# Altium footprint library pcb_Active.PcbLib: 86 footprints (part 1 of 6)
Each footprint in its own frame and in the unit in brackets; x right, y up, seen from the top. Pads: shape width x height; smd on the part's side, far side on the other; paste and mask are expansions set on the pad; w line width, h text height; cw(c..) or ccw(c..) is an arc to the next point about the centre after c.
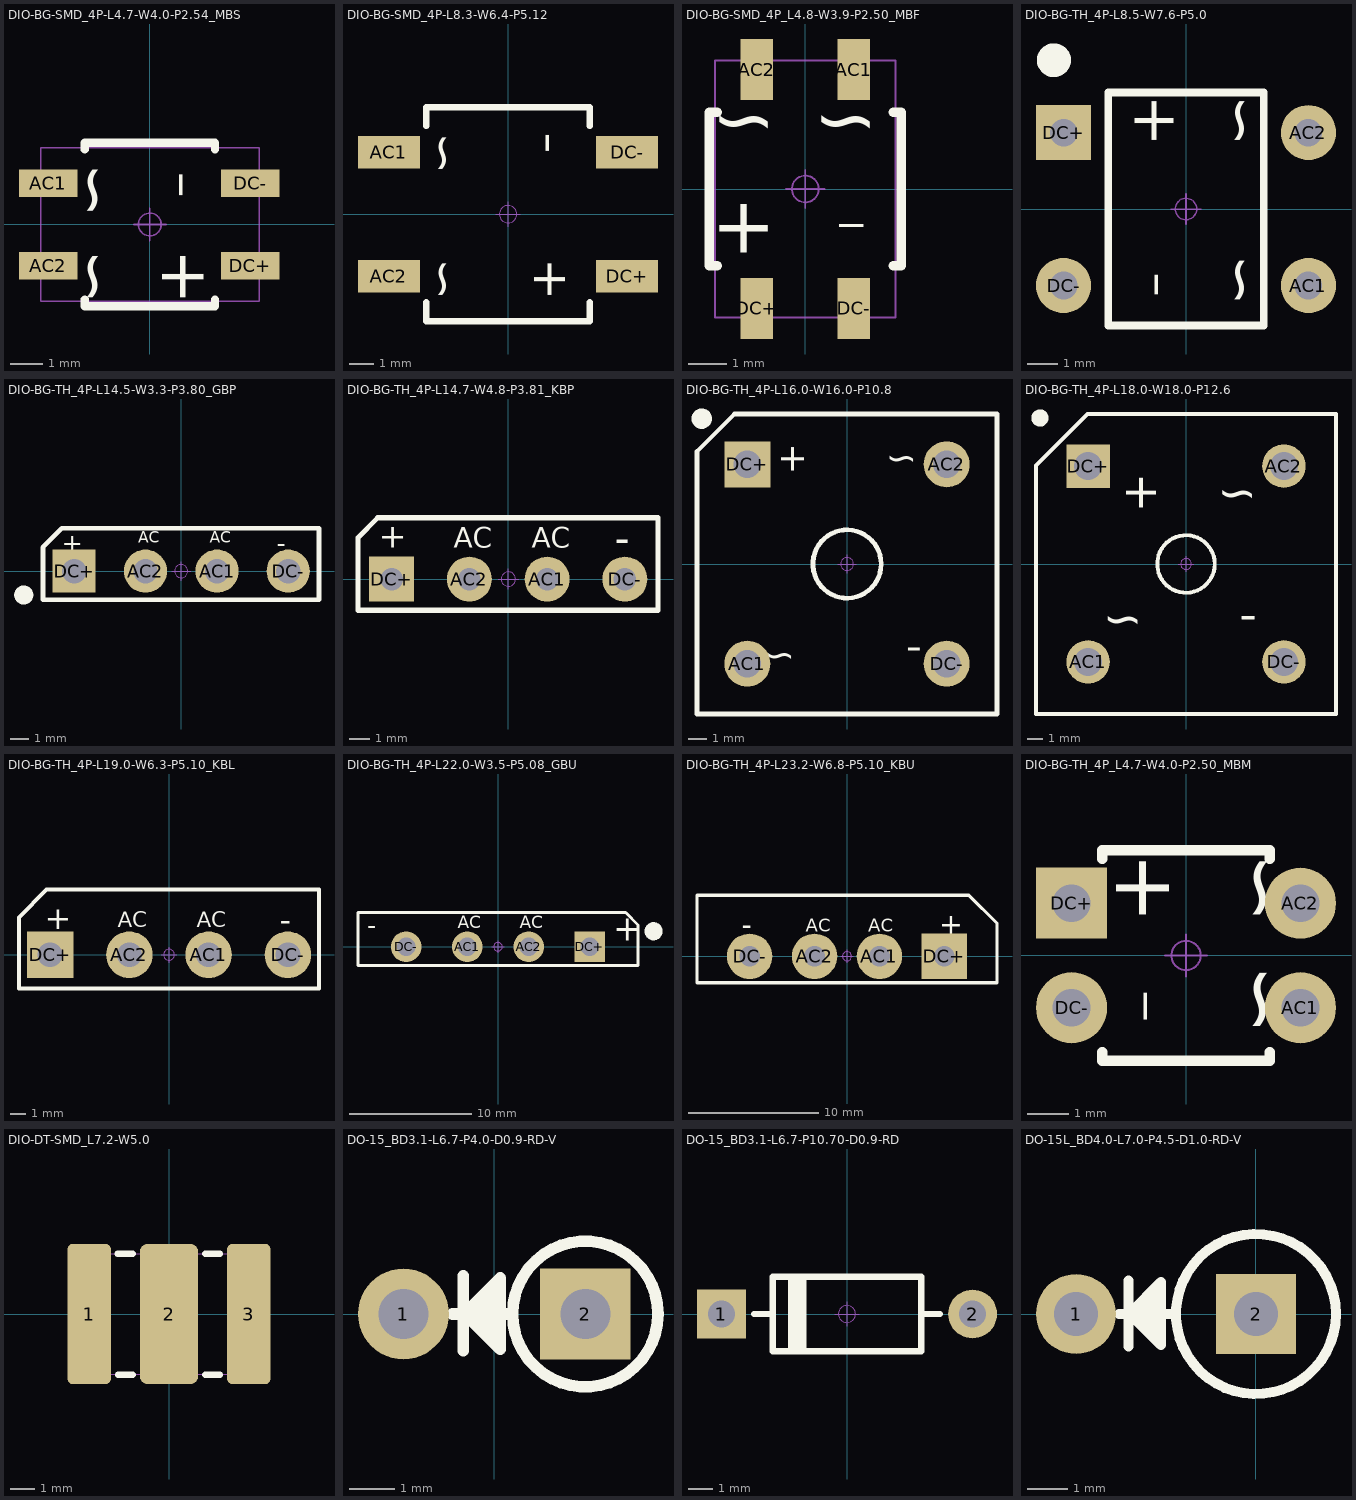
[diagram p0: the footprints below, top view; thin cyan lines are the x and y axes]

## DIO-BG-SMD_4P-L4.7-W4.0-P2.54_MBS [mm] "4.1*6.8*2.5mm(长宽高)"
height 12.3
pads (4):
  rect 1.8x0.85 smd: AC1(-3.127,1.27) AC2(-3.127,-1.27) DC+(3.096,-1.27) DC-(3.096,1.27)
Top Overlay:
  lines w0.254: -2.007,-2.311 -2.007,-2.515 2.007,-2.515 2.007,-2.311 ; -2.007,2.311 -2.007,2.515 2.007,2.515 2.007,2.311
  text "+" at 2.159,-0.762 h2.54
  text "-" at 2.159,1.651 h3.05
  text "~" at -0.635,-0.762 h2.54
  text "~" at -0.635,1.905 h2.54
Mechanical 13:
  lines w0.05: -3.363,-2.363 3.363,-2.363 3.363,2.362 -3.363,2.362 -3.363,-2.363
Mechanical 15:
  circle w0.05: c0,0 r0.35
  lines w0.05: -0.5,0 0.5,0 ; 0,-0.5 0,0.5
Mechanical 16:
  text ".Designator" at 0,0 h1
3D body "MBS.STEP": height 2.6, standoff -0.03, extent -3.4,-2.4 3.4,2.4

## DIO-BG-SMD_4P-L8.3-W6.4-P5.12 [mm] "8.5*10.1*3mm(长宽高)"
height 12.3
pads (4):
  rect 2.5x1.3 smd: AC1(-4.8,2.5) AC2(-4.8,-2.5) DC+(4.8,-2.5) DC-(4.8,2.5)
Top Overlay:
  lines w0.254: -3.302,-3.556 -3.302,-4.318 3.302,-4.318 3.302,-3.556 ; -3.302,3.556 -3.302,4.318 3.302,4.318 3.302,3.556
  text "+" at 2.794,-1.778 h2.54
  text "-" at 2.794,3.302 h3.05
  text "~" at -1.524,-1.778 h2.54
  text "~" at -1.524,3.302 h2.54
Mechanical 15:
  circle w0.05: c0,0 r0.35
  lines w0.05: -0.5,0 0.5,0 ; 0,-0.5 0,0.5
Mechanical 16:
  text ".Designator" at 0,0 h1
3D body "DBS.STEP": height 3.1, standoff -0.03, extent -5.05,-4.25 5.05,4.25

## DIO-BG-SMD_4P_L4.8-W3.9-P2.50_MBF [mm] "4.7*7*1.5mm(长宽高)"
height 12.3
pads (4):
  rect 0.85x1.6 smd: AC1(1.27,3.127) AC2(-1.27,3.127) DC+(-1.27,-3.127) DC-(1.27,-3.127)
Top Overlay:
  lines w0.254: -2.311,-2.007 -2.515,-2.007 -2.515,2.007 -2.311,2.007 ; 2.311,-2.007 2.515,-2.007 2.515,2.007 2.311,2.007
  text "~" at 1.905,0.635 h2.54
  text "~" at -0.762,0.635 h2.54
  text "-" at 1.651,-2.159 h3.05
  text "+" at -0.762,-2.159 h2.54
Mechanical 13:
  lines w0.05: -2.363,-3.363 2.362,-3.363 2.362,3.363 -2.363,3.363 -2.363,-3.363
Mechanical 15:
  circle w0.05: c0,0 r0.35
  lines w0.05: -0.5,0 0.5,0 ; 0,-0.5 0,0.5
Mechanical 16:
  text ".Designator" at 0,0 h1
3D body "MBF.STEP": height 1.6, standoff -0.03, extent -2.35,-3.5 2.35,3.5

## DIO-BG-TH_4P-L8.5-W7.6-P5.0 [mm] "8.5*7.6*3mm(长宽高)"
pads (4):
  round 1.8 hole 0.9: AC1(4.004,-2.5) AC2(4.004,2.5) DC-(-4.004,-2.5)
  rect 1.8x1.8 hole 0.9: DC+(-4.004,2.5)
Top Overlay:
  circle w0.6: c-4.318,4.866 r0.254
  lines w0.254: -2.54,-3.81 2.54,-3.81 2.54,3.81 -2.54,3.81 -2.54,-3.81
  text "~" at 0.635,-3.175 h2.54
  text "~" at 0.635,2.032 h2.54
  text "-" at -2.159,-2.921 h3.05
  text "+" at -2.159,2.032 h2.54
Mechanical 15:
  circle w0.05: c0,0 r0.35
  lines w0.05: -0.5,0 0.5,0 ; 0,-0.5 0,0.5
Mechanical 16:
  text ".Designator" at 0,0 h1
3D body "DB.STEP": height 3.2, standoff -3.01, extent -4.436,-4.25 4.436,4.25

## DIO-BG-TH_4P-L14.5-W3.3-P3.80_GBP [mm] "14.2*2.9*10.5mm(长宽高)"
pads (4):
  round 2.3 hole 1.3: AC1(1.91,0) AC2(-1.9,0) DC-(5.7,0)
  rect 2.3x2.3 hole 1.3: DC+(-5.7,0)
Top Overlay:
  circle w0.508: c-8.382,-1.27 r0.254
  lines w0.254: -7.36,-1.524 7.34,-1.524 7.34,2.286 -6.35,2.286 -7.36,1.276 -7.36,-1.524
  text "AC" at -2.286,1.524 h0.6
  text "-" at 5.08,1.016 h1
  text "+" at -6.35,1.016 h1
  text "AC" at 1.524,1.524 h0.6
Mechanical 15:
  circle w0.05: c0,0 r0.35
  lines w0.05: -0.5,0 0.5,0 ; 0,-0.5 0,0.5
Mechanical 16:
  text ".Designator" at 0,0 h1
3D body "GBP.STEP": height 12.8, standoff -3.6, extent -7.1,-1 7.1,1.9

## DIO-BG-TH_4P-L14.7-W4.8-P3.81_KBP [mm] "14.7*4.8*12.2mm(长宽高)"
pads (4):
  round 2.2 hole 1.1: AC1(1.9,0) AC2(-1.91,0) DC-(5.71,0)
  rect 2.2x2.2 hole 1.1: DC+(-5.72,0)
Top Overlay:
  lines w0.254: -7.37,-1.524 7.33,-1.524 7.33,3 -6.398,3 -7.37,2.028 -7.37,-1.524
  text "AC" at 1.138,1.524 h1
  text "AC" at -2.672,1.524 h1
  text "-" at 5.207,1.27 h1.5
  text "+" at -6.35,1.524 h1.2
Mechanical 15:
  circle w0.05: c0,0 r0.35
  lines w0.05: -0.5,0 0.5,0 ; 0,-0.5 0,0.5
Mechanical 16:
  text ".Designator" at 0,0 h1
3D body "KBP.STEP": height 11.7, standoff -3.1, extent -7.35,-1.25 7.35,2.95

## DIO-BG-TH_4P-L16.0-W16.0-P10.8 [mm] "18*7.1mm(宽高)"
pads (4):
  round 2.5 hole 1.5: AC1(-5.4,-5.4) AC2(5.4,5.4) DC-(5.4,-5.4)
  rect 2.5x2.5 hole 1.5: DC+(-5.4,5.4)
Top Overlay:
  circle w0.254: c0,0 r1.85
  circle w0.6: c-7.874,7.874 r0.254
  lines w0.254: -8.128,-8.128 -8.128,6.096 -6.096,8.128 8.128,8.128 8.128,-8.128 -8.128,-8.128
  text "+" at -4.064,4.826 h2.54
  text "-" at 4.064,-5.842 h3.05
  text "~" at 3.81,4.572 h2.54
  text "~" at -2.794,-6.096 h2.54
Mechanical 15:
  circle w0.05: c0,0 r0.35
  lines w0.05: -0.5,0 0.5,0 ; 0,-0.5 0,0.5
Mechanical 16:
  text ".Designator" at 0,0 h1
3D body "BR3.STEP": height 6, standoff -3.5, extent -8,-8 8,8

## DIO-BG-TH_4P-L18.0-W18.0-P12.6 [mm] "16*8mm(宽高)"
pads (4):
  round 2.8 hole 1.8: AC1(-6.3,-6.3) AC2(6.3,6.3) DC-(6.3,-6.3)
  rect 2.8x2.8 hole 1.8: DC+(-6.3,6.3)
Top Overlay:
  circle w0.6: c-9.398,9.398 r0.254
  circle w0.254: c0,0 r1.85
  lines w0.254: -9.652,-9.652 9.652,-9.652 9.652,9.652 -6.35,9.652 -9.652,6.35 -9.652,-9.652
  text "~" at -2.794,-5.334 h3.81
  text "~" at 4.572,2.794 h3.81
  text "-" at 4.572,-5.08 h4
  text "+" at -4.572,3.302 h3.81
Mechanical 15:
  circle w0.05: c0,0 r0.35
  lines w0.05: -0.5,0 0.5,0 ; 0,-0.5 0,0.5
Mechanical 16:
  text ".Designator" at 0,0 h1
3D body "BR8.STEP": height 7.1, standoff -3.5, extent -9.45,-9.45 9.45,9.45

## DIO-BG-TH_4P-L19.0-W6.3-P5.10_KBL [mm] "19*6.25*15.7mm(长宽高)"
pads (4):
  round 3 hole 1.6: AC1(2.55,0) AC2(-2.55,0) DC-(7.65,0)
  rect 3x3 hole 1.6: DC+(-7.65,0)
Top Overlay:
  lines w0.254: -9.652,-2.159 -9.652,2.413 -7.874,4.191 9.652,4.191 9.652,-2.159 -9.652,-2.159
  text "+" at -8.001,1.651 h1.5
  text "-" at 7.112,1.524 h1.5
  text "AC" at -3.302,1.778 h1
  text "AC" at 1.778,1.778 h1
Mechanical 15:
  circle w0.05: c0,0 r0.35
  lines w0.05: -0.5,0 0.5,0 ; 0,-0.5 0,0.5
Mechanical 16:
  text ".Designator" at 0,0 h1
3D body "KBL.STEP": height 14.21, standoff -3.49, extent -9.5,-2.1 9.5,4.15

## DIO-BG-TH_4P-L22.0-W3.5-P5.08_GBU [mm] "整流桥，脚距：5mm/200mil"
pads (4):
  round 2.5 hole 1.5: AC1(-2.5,0) AC2(2.5,0) DC-(-7.5,0)
  rect 2.5x2.5 hole 1.5: DC+(7.5,0)
Top Overlay:
  circle w0.762: c12.7,1.27 r0.359
  lines w0.254: -11.43,-1.524 11.43,-1.524 11.43,1.778 10.414,2.794 -8.422,2.794 -11.43,2.794 -11.43,-1.524
  text "AC" at 1.778,1.524 h1.02
  text "AC" at -3.302,1.524 h1.02
  text "+" at 9.398,0.508 h2.03
  text "-" at -10.668,1.016 h1.52
Mechanical 15:
  circle w0.05: c0,0 r0.35
  lines w0.05: -0.5,0 0.5,0 ; 0,-0.5 0,0.5
Mechanical 16:
  text ".Designator" at 0,0 h1
3D body "GBU.STEP": height 20.8, standoff -4, extent -11,-1.15 11,2.35

## DIO-BG-TH_4P-L23.2-W6.8-P5.10_KBU [mm] "23*6.6*19.1mm(长宽高)"
pads (4):
  round 3.5 hole 1.6: AC1(2.5,0) AC2(-2.5,0) DC-(-7.5,0)
  rect 3.5x3.5 hole 1.6: DC+(7.5,0)
Top Overlay:
  lines w0.254: -11.557,-2.032 -11.557,4.699 9.398,4.699 11.557,2.54 11.557,-2.032 -11.557,-2.032
  text "+" at 7.112,1.651 h1.6
  text "-" at -8.128,1.651 h1.6
  text "AC" at -3.175,1.905 h1
  text "AC" at 1.651,1.905 h1
Mechanical 15:
  circle w0.05: c0,0 r0.35
  lines w0.05: -0.5,0 0.5,0 ; 0,-0.5 0,0.5
Mechanical 16:
  text ".Designator" at 0,0 h1
3D body "KBU.STEP": height 19, standoff -3.49, extent -11.5,-2 11.5,4.6

## DIO-BG-TH_4P_L4.7-W4.0-P2.50_MBM [mm] "4.8*5.2*2.5mm(长宽高)"
pads (4):
  round 1.7 hole 0.9: AC1(2.737,-1.25) AC2(2.737,1.25) DC-(-2.737,-1.25)
  rect 1.7x1.7 hole 0.9: DC+(-2.737,1.25)
Top Overlay:
  lines w0.254: -2.007,-2.311 -2.007,-2.515 2.007,-2.515 2.007,-2.311 ; -2.007,2.311 -2.007,2.515 2.007,2.515 2.007,2.311
  text "~" at 0.635,-1.905 h2.54
  text "~" at 0.635,0.762 h2.54
  text "-" at -2.159,-1.651 h3.05
  text "+" at -2.159,0.762 h2.54
Mechanical 15:
  circle w0.05: c0,0 r0.35
  lines w0.05: -0.5,0 0.5,0 ; 0,-0.5 0,0.5
Mechanical 16:
  text ".Designator" at 0,0 h1
3D body "MBM.STEP": height 2.6, standoff -3.11, extent -3.154,-2.4 3.094,2.4

## DIO-DT-SMD_L7.2-W5.0 [mm]
pads (3):
  rrect25% 1.8x5.8 smd mask+0.051: 1(-3.3,0) 3(3.3,0)
  rrect25% 2.4x5.8 smd mask+0.051: 2(0,0)
Top Overlay:
  lines w0.254: -2.13,2.49 -1.5,2.49 ; -2.115,-2.51 -1.5,-2.51 ; 1.5,-2.51 2.105,-2.51 ; 1.5,2.49 2.115,2.49
Mechanical 6:
  lines w0.254: -3.6,-2.51 -3.6,2.49 ; 3.6,-2.51 3.6,2.49
Mechanical 15:
  region: -3.54,-2.5 -3.54,-2.476 -3.575,-2.441 -3.624,-2.441 -3.659,-2.475 -3.66,-2.5 -3.659,-2.524 -3.624,-2.559 -3.576,-2.559 -3.541,-2.524
  region: -3.6,2.5 -3.2,2.5 -3.2,-2.5 -3.6,-2.5
  region: 3.2,2.5 3.6,2.5 3.6,-2.5 3.2,-2.5
  region: -0.75,2.5 0.75,2.5 0.75,-2.5 -0.75,-2.5
  lines w0.051: -3.6,-2.5 -3.6,2.5 3.6,2.5 3.6,-2.5 -3.6,-2.5
Mechanical 16:
  text ".Designator" at 0,0 h1
3D body "3D_PCB1_2024-04-03.step": height 5, standoff 0, extent -3.6,-2.5 3.6,2.5

## DO-15_BD3.1-L6.7-P4.0-D0.9-RD-V [mm] "3.3*4mm(直径，脚距）"
pads (2):
  round 2 hole 1.1: 1(-2,0)
  rect 2x2 hole 1.1: 2(2,0)
Top Overlay:
  circle w0.254: c2,0 r1.6
  lines w0.254: -0.921,0 0.4,0 ; -0.682,-0.805 -0.682,0.841 ; -0.682,0.038 0.131,-0.775 0.131,0.792 -0.642,0.02 ; -0.286,0.254 -0.286,0 -0.286,-0.254 -0.54,0 -0.057,0.432 -0.032,-0.559
Mechanical 16:
  text ".Designator" at 0,0 h1
3D body "DO-15-V.STEP": height 8.35, standoff -3.45, extent -2.4,-1.639 3.651,1.65

## DO-15_BD3.1-L6.7-P10.70-D0.9-RD [mm] "3.3*10.3mm(直径，脚距）"
pads (2):
  rect 2x2 hole 1.1: 1(-5.15,0)
  round 2 hole 1.1: 2(5.15,0)
Top Overlay:
  rectangle: -2.286,-1.524 -1.778,1.524
  lines w0.254: -3.81,0 -3.048,0 ; -2.286,-1.524 -2.286,1.524 ; -2.032,-1.524 -2.032,1.524 ; -1.778,-1.524 -1.778,1.524 ; 3.048,0 3.81,0 ; -3.048,-1.524 -3.048,1.524 3.048,1.524 3.048,-1.524 -3.048,-1.524
Mechanical 15:
  circle w0.05: c0,0 r0.35
  lines w0.05: -0.5,0 0.5,0 ; 0,-0.5 0,0.5
Mechanical 16:
  text ".Designator" at 0,0 h1
3D body "DO-15.STEP": height 3.35, standoff -3.45, extent -5.55,-1.639 5.55,1.639

## DO-15L_BD4.0-L7.0-P4.5-D1.0-RD-V [mm] "4*4.5mm(直径，脚距）"
pads (2):
  round 2 hole 1.1: 1(-4.5,0)
  rect 2x2 hole 1.1: 2(0,0)
Top Overlay:
  circle w0.254: c0,0 r2
  lines w0.254: -3.429,0 -2.108,0 ; -3.19,-0.805 -3.19,0.841 ; -3.19,0.038 -2.377,-0.775 -2.377,0.792 -3.15,0.02 ; -2.794,0.254 -2.794,0 -2.794,-0.254 -3.048,0 -2.565,0.432 -2.54,-0.559
Mechanical 16:
  text ".Designator" at -2,0 h1
3D body "DO-15L-V.STEP": height 9.45, standoff -3.45, extent -4.9,-1.99 2.001,2